# Altium footprint library CADTcommon.PcbLib: 503 footprints (part 7 of 32)
Each footprint in its own frame and in the unit in brackets; x right, y up, seen from the top. Pads: shape width x height; smd on the part's side, far side on the other; paste and mask are expansions set on the pad; w line width, h text height; cw(c..) or ccw(c..) is an arc to the next point about the centre after c.
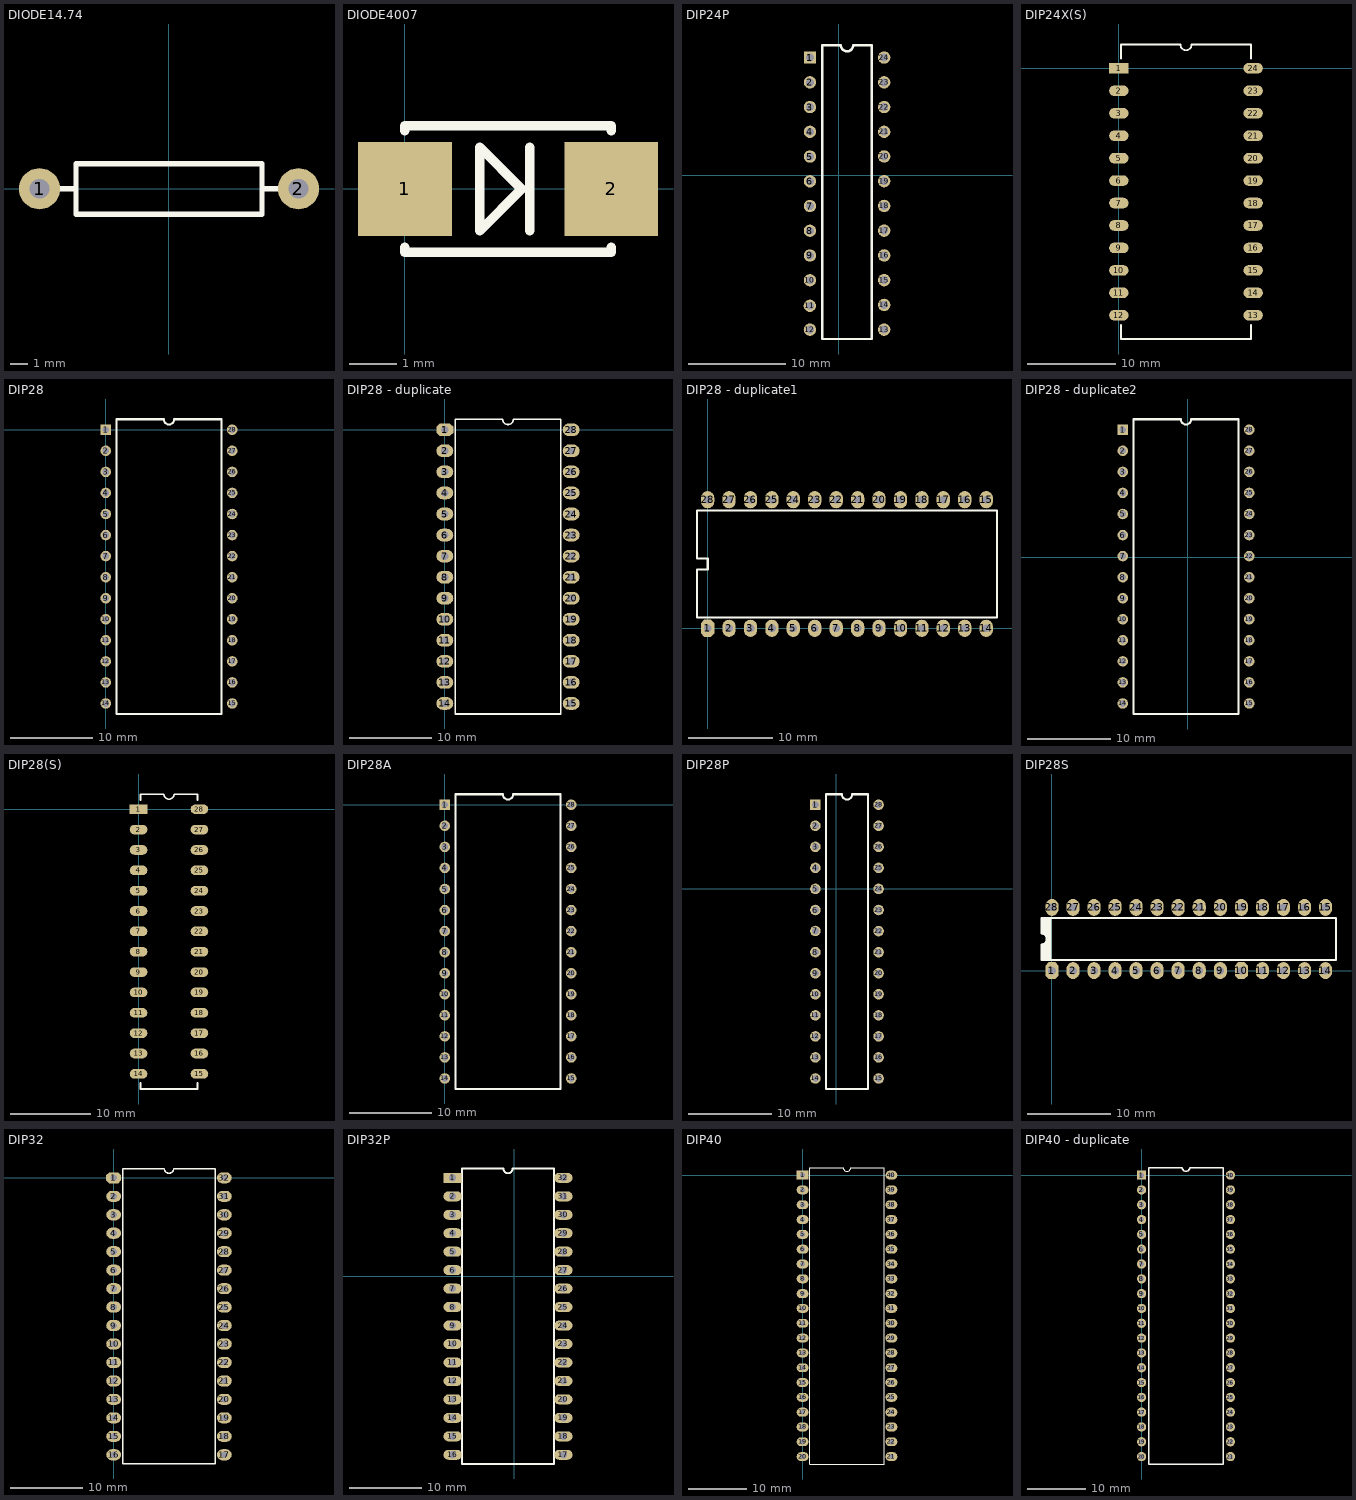
[diagram p6: the footprints below, top view; thin cyan lines are the x and y axes]

## DIODE14.74 [mm]
pads (2):
  round 2.3 hole 1.1: 1(-7.214,0) 2(7.239,0)
Top Overlay:
  lines w0.305: -6.325,0 -5.182,0 ; 5.207,0 6.375,0 ; -5.182,-1.422 -5.182,1.397 5.207,1.397 5.207,-1.422 -5.182,-1.422
3D body: height 0.5, standoff -4.1, extent -6.706,-1.454 6.756,1.403

## DIODE4007 [mm]
height 1.2
pads (2):
  rect 2x2 smd: 1(0,0) 2(4.4,0)
Top Overlay:
  lines w0.2: 0,-1.239 0,-1.35 4.4,-1.35 4.4,-1.239 ; 0,1.239 0,1.35 4.4,1.35 4.4,1.239 ; 2.667,-0.889 2.667,0 2.667,0.889 ; 1.6,-0.889 2.489,0 1.6,0.889 1.6,-0.889

## DIP24P [mil]
pads (24):
  rect 50x50 hole 32: 1(-116.38,475.28)
  round 50 hole 32: 2(-116.38,375.28) 3(-116.38,275.28) 4(-116.38,175.28) 5(-116.38,75.28) 6(-116.38,-24.72) 7(-116.38,-124.72) 8(-116.38,-224.72) 9(-116.38,-324.72) 10(-116.38,-424.72) 11(-116.93,-527.95) 12(-116.54,-624.41) 13(183.46,-624.41) 14(183.46,-524.41) 15(183.46,-424.41) 16(183.46,-324.41) 17(183.46,-224.41) 18(183.46,-124.41) 19(183.46,-24.41) 20(183.46,75.59) 21(183.62,175.28) 22(183.62,275.28) 23(183.62,375.28) 24(183.62,475.28)
Top Overlay:
  lines w10: -66.93,-662.2 133.07,-662.2 ; -66.93,-659.84 -66.38,525.28 8.62,525.28 ccw(c33.62,525.28) 58.62,525.28 133.62,525.28 133.86,-659.84

## DIP24X(S) [mm]
pads (24):
  rect 2.2x1.2 smd: 1(0,0)
  oval 2.2x1.2 smd: 2(0,-2.54) 3(0,-5.08) 4(0,-7.62) 5(0,-10.16) 6(0,-12.7) 7(0,-15.24) 8(0,-17.78) 9(0,-20.32) 10(0,-22.86) 11(0,-25.4) 12(0,-27.94) 13(15.2,-27.94) 14(15.2,-25.4) 15(15.2,-22.86) 16(15.2,-20.32) 17(15.2,-17.78) 18(15.2,-15.24) 19(15.2,-12.7) 20(15.2,-10.16) 21(15.2,-7.62) 22(15.2,-5.08) 23(15.2,-2.54) 24(15.2,0)
Top Overlay:
  lines w0.2: 0.235,-29.04 0.235,-30.62 14.965,-30.62 14.965,-29.04 ; 0.235,1.1 0.235,2.68 6.965,2.68 ccw(c7.6,2.68) 8.235,2.68 14.965,2.68 14.965,1.1

## DIP28 [mil]
pads (28):
  rect 50x50 hole 32: 1(0,0)
  round 50 hole 32: 2(0,-100) 3(0,-200) 4(0,-300) 5(0,-400) 6(0,-500) 7(0,-600) 8(0,-700) 9(0,-800) 10(0,-900) 11(0,-1000) 12(0,-1100) 13(0,-1200) 14(0,-1300) 15(600,-1300) 16(600,-1200) 17(600,-1100) 18(600,-1000) 19(600,-900) 20(600,-800) 21(600,-700) 22(600,-600) 23(600,-500) 24(600,-400) 25(600,-300) 26(600,-200) 27(600,-100) 28(600,0)
Top Overlay:
  lines w10: 50,-1350 50,50 275,50 ccw(c300,50) 325,50 550,50 550,-1350 50,-1350

## DIP28 - duplicate [mil]
pads (28):
  oct 80x60 hole 35: 1(0,0)
  oval 80x60 hole 35: 2(0,-100) 3(0,-200) 4(0,-300) 5(0,-400) 6(0,-500) 7(0,-600) 8(0,-700) 9(0,-800) 10(0,-900) 11(0,-1000) 12(0,-1100) 13(0,-1200) 14(0,-1300) 15(600,-1300) 16(600,-1200) 17(600,-1100) 18(600,-1000) 19(600,-900) 20(600,-800) 21(600,-700) 22(600,-600) 23(600,-500) 24(600,-400) 25(600,-300) 26(600,-200) 27(600,-100) 28(600,0)
Top Overlay:
  lines w7.87: 50,-1350 550,-1350 550,50 325,50 cw(c300,50) 275,50 50,50 50,-1350

## DIP28 - duplicate1 [mil]
pads (28):
  oct 62x80 hole 36: 1(0,0)
  oval 62x80 hole 36: 2(100,0) 3(200,0) 4(300,0) 5(400,0) 6(500,0) 7(600,0) 8(700,0) 9(800,0) 10(900,0) 11(1000,0) 12(1100,0) 13(1200,0) 14(1300,0) 15(1300,600) 16(1200,600) 17(1100,600) 18(1000,600) 19(900,600) 20(800,600) 21(700,600) 22(600,600) 23(500,600) 24(400,600) 25(300,600) 26(200,600) 27(100,600) 28(0,600)
Top Overlay:
  lines w10: -49.5,49.96 1350.5,49.96 1350.5,549.96 -49.5,549.96 -49.5,324.96 0.5,324.96 0.5,274.96 -49.5,274.96 -49.5,49.96

## DIP28 - duplicate2 [mm]
pads (28):
  rect 1.27x1.27 hole 0.813: 1(-7.85,15.36)
  round 1.27 hole 0.813: 2(-7.85,12.82) 3(-7.85,10.28) 4(-7.85,7.74) 5(-7.85,5.2) 6(-7.85,2.66) 7(-7.85,0.12) 8(-7.85,-2.42) 9(-7.85,-4.96) 10(-7.85,-7.5) 11(-7.85,-10.04) 12(-7.85,-12.58) 13(-7.85,-15.12) 14(-7.85,-17.66) 15(7.39,-17.66) 16(7.39,-15.12) 17(7.39,-12.58) 18(7.39,-10.04) 19(7.39,-7.5) 20(7.39,-4.96) 21(7.39,-2.42) 22(7.39,0.12) 23(7.39,2.66) 24(7.39,5.2) 25(7.39,7.74) 26(7.39,10.28) 27(7.39,12.82) 28(7.39,15.36)
Top Overlay:
  lines w0.254: -6.58,-18.93 6.12,-18.93 6.12,16.63 0.405,16.63 cw(c-0.23,16.63) -0.865,16.63 -6.58,16.63 -6.58,-18.93

## DIP28(S) [mm]
pads (28):
  rect 2.2x1.2 smd: 1(0,0)
  oval 2.2x1.2 smd: 2(0,-2.54) 3(0,-5.08) 4(0,-7.62) 5(0,-10.16) 6(0,-12.7) 7(0,-15.24) 8(0,-17.78) 9(0,-20.32) 10(0,-22.86) 11(0,-25.4) 12(0,-27.94) 13(0,-30.48) 14(0,-33.02) 15(7.6,-33.02) 16(7.6,-30.48) 17(7.6,-27.94) 18(7.6,-25.4) 19(7.6,-22.86) 20(7.6,-20.32) 21(7.6,-17.78) 22(7.6,-15.24) 23(7.6,-12.7) 24(7.6,-10.16) 25(7.6,-7.62) 26(7.6,-5.08) 27(7.6,-2.54) 28(7.6,0)
Top Overlay:
  lines w0.2: 0.245,-34.12 0.245,-34.91 7.355,-34.91 7.355,-34.12 ; 0.245,1.1 0.245,1.89 3.165,1.89 ccw(c3.8,1.89) 4.435,1.89 7.355,1.89 7.355,1.1

## DIP28A [mil]
pads (28):
  rect 50x50 hole 32: 1(0,0)
  round 50 hole 32: 2(0,-100) 3(0,-200) 4(0,-300) 5(0,-400) 6(0,-500) 7(0,-600) 8(0,-700) 9(0,-800) 10(0,-900) 11(0,-1000) 12(0,-1100) 13(0,-1200) 14(0,-1300) 15(600,-1300) 16(600,-1200) 17(600,-1100) 18(600,-1000) 19(600,-900) 20(600,-800) 21(600,-700) 22(600,-600) 23(600,-500) 24(600,-400) 25(600,-300) 26(600,-200) 27(600,-100) 28(600,0)
Top Overlay:
  lines w10: 50,-1350 50,50 275,50 ccw(c300,50) 325,50 550,50 550,-1350 50,-1350

## DIP28P [mil]
pads (28):
  rect 50x50 hole 32: 1(-99.43,399.13)
  round 50 hole 32: 2(-99.43,299.13) 3(-99.43,199.13) 4(-99.43,99.13) 5(-99.43,-0.87) 6(-99.43,-100.87) 7(-99.5,-200.5) 8(-99.5,-301) 9(-99.43,-401.37) 10(-99.43,-501.37) 11(-99.43,-601.37) 12(-99.43,-701.37) 13(-99.43,-801.37) 14(-99.43,-901.37) 15(200.57,-901.37) 16(200.57,-801.37) 17(200.57,-701.37) 18(200.57,-601.37) 19(200.57,-501.37) 20(200.57,-401.37) 21(200.57,-301.37) 22(200.57,-200.87) 23(200.57,-100.87) 24(200.57,-0.87) 25(200.57,99.13) 26(200.57,199.13) 27(200.57,299.13) 28(200.57,399.13)
Top Overlay:
  lines w10: -49.43,-251.37 -49.43,-951.37 150.57,-951.37 150.57,-251.37 ; -49.43,-250.87 -49.43,449.13 25.57,449.13 ccw(c50.57,449.13) 75.57,449.13 150.57,449.13 150.57,-250.87

## DIP28S [mil]
pads (28):
  oct 62x80 hole 36: 1(0,0) 10(900,0)
  oval 62x80 hole 36: 2(100,0) 3(200,0) 4(300,0) 5(400,0) 6(500,0) 7(600,0) 8(700,0) 9(800,0) 11(1000,0) 12(1100,0) 13(1200,0) 14(1300,0) 15(1300,300) 16(1200,300) 17(1100,300) 18(1000,300) 19(900,300) 20(800,300) 21(700,300) 22(600,300) 23(500,300) 24(400,300) 25(300,300) 26(200,300) 27(100,300) 28(0,300)
Top Overlay:
  region: -2,125 -51,125 -51,50 -2,50
  region: -2,250 -28,250 -28,125 -2,125
  region: -22,250 -51,250 -51,178 -22,178
  lines w8: -51,50 -51,125 ccw(c-51,150) -51,175 -51,250
  lines w10: -50.31,50.13 1350,50 1350,250 -50.31,250.13 ; -40,180 -34,174 -27,174 -27,167 ; -35,125 -28,125 -28,133

## DIP32 [mil]
pads (32):
  oct 80x60 hole 35: 1(0,0)
  oval 80x60 hole 35: 2(0,-100) 3(0,-200) 4(0,-300) 5(0,-400) 6(0,-500) 7(0,-600) 8(0,-700) 9(0,-800) 10(0,-900) 11(0,-1000) 12(0,-1100) 13(0,-1200) 14(0,-1300) 15(0,-1400) 16(0,-1500) 17(600,-1500) 18(600,-1400) 19(600,-1300) 20(600,-1200) 21(600,-1100) 22(600,-1000) 23(600,-900) 24(600,-800) 25(600,-700) 26(600,-600) 27(600,-500) 28(600,-400) 29(600,-300) 30(600,-200) 31(600,-100) 32(600,0)
Top Overlay:
  lines w7.87: 50,-1550 50,50 275,50 ccw(c300,50) 325,50 550,50 550,-1550 50,-1550

## DIP32P [mm]
pads (32):
  rect 2.5x1.38 hole 1: 1(-8.458,13.538)
  oval 2.5x1.38 hole 1: 2(-8.458,10.998) 3(-8.458,8.458) 4(-8.458,5.918) 5(-8.458,3.378) 6(-8.458,0.838) 7(-8.458,-1.702) 8(-8.458,-4.242) 9(-8.458,-6.782) 10(-8.458,-9.322) 11(-8.458,-11.862) 12(-8.458,-14.402) 13(-8.458,-16.942) 14(-8.458,-19.482) 15(-8.458,-22.022) 16(-8.458,-24.562) 17(6.782,-24.562) 18(6.782,-22.022) 19(6.782,-19.482) 20(6.782,-16.942) 21(6.782,-14.402) 22(6.782,-11.862) 23(6.782,-9.322) 24(6.782,-6.782) 25(6.782,-4.242) 26(6.782,-1.702) 27(6.782,0.838) 28(6.782,3.378) 29(6.782,5.918) 30(6.782,8.458) 31(6.782,10.998) 32(6.782,13.538)
Top Overlay:
  lines w0.254: -7.188,-25.832 5.512,-25.832 5.512,14.808 -0.203,14.808 cw(c-0.838,14.808) -1.473,14.808 -7.188,14.808 -7.188,-25.832

## DIP40 [mil]
pads (40):
  rect 80x60 hole 35: 1(0,0)
  oval 80x60 hole 35: 2(0,-100) 3(0,-200) 4(0,-300) 5(0,-400) 6(0,-500) 7(0,-600) 8(0,-700) 9(0,-800) 10(0,-900) 11(0,-1000) 12(0,-1100) 13(0,-1200) 14(0,-1300) 15(0,-1400) 16(0,-1500) 17(0,-1600) 18(0,-1700) 19(0,-1800) 20(0,-1900) 21(600,-1900) 22(600,-1800) 23(600,-1700) 24(600,-1600) 25(600,-1500) 26(600,-1400) 27(600,-1300) 28(600,-1200) 29(600,-1100) 30(600,-1000) 31(600,-900) 32(600,-800) 33(600,-700) 34(600,-600) 35(600,-500) 36(600,-400) 37(600,-300) 38(600,-200) 39(600,-100) 40(600,0)
Top Overlay:
  lines w7.87: 50,-1950 50,50 275,50 ccw(c300,50) 325,50 550,50 550,-1950 50,-1950

## DIP40 - duplicate [mil]
pads (40):
  rect 62x62 hole 36: 1(0,0)
  round 62 hole 36: 2(0,-100) 3(0,-200) 4(0,-300) 5(0,-400) 6(0,-500) 7(0,-600) 8(0,-700) 9(0,-800) 10(0,-900) 11(0,-1000) 12(0,-1100) 13(0,-1200) 14(0,-1300) 15(0,-1400) 16(0,-1500) 17(0,-1600) 18(0,-1700) 19(0,-1800) 20(0,-1900) 21(600,-1900) 22(600,-1800) 23(600,-1700) 24(600,-1600) 25(600,-1500) 26(600,-1400) 27(600,-1300) 28(600,-1200) 29(600,-1100) 30(600,-1000) 31(600,-900) 32(600,-800) 33(600,-700) 34(600,-600) 35(600,-500) 36(600,-400) 37(600,-300) 38(600,-200) 39(600,-100) 40(600,0)
Top Overlay:
  lines w10: 50,-1950 550,-1950 550,50 325,50 cw(c300,50) 275,50 50,50 50,-1950